# Altium schematic symbol library Analog Devices Data Converters Analog-to-Digital Converters.SchLib: 2404 symbols (part 158 of 213)
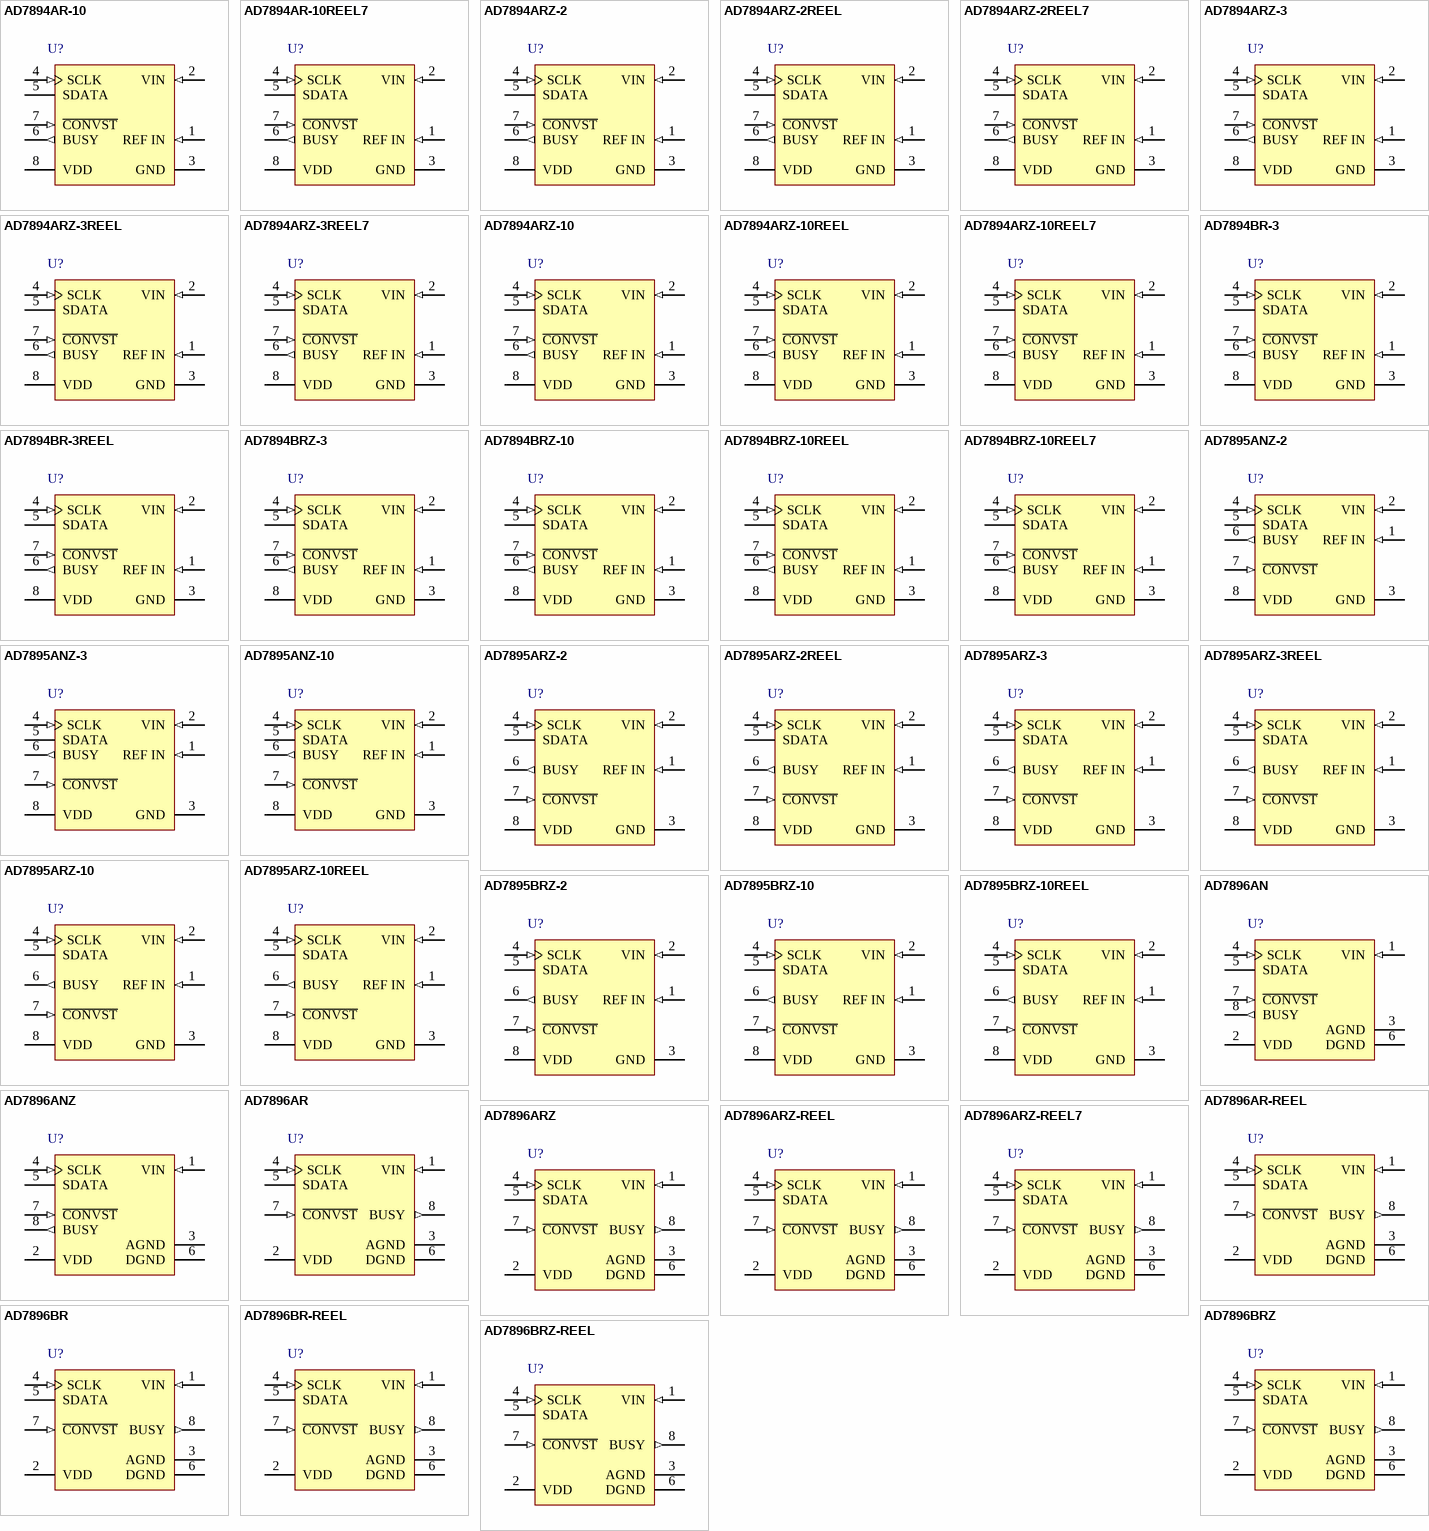
[diagram p313: symbols AD7894AR-10 to AD7896BRZ-REEL]

## AD7896ARZ
designator U?
Single 12-Bit Analog-to-Digital Converter with Serial Interface, 8 us, 2.7 V to 5.5 V, 100KSPS, -40 to +85 degC, R-8, Pb-Free, Tube; Generic Part Number: AD7896; Manufacturer: Analog Devices; PartNumber: AD7896ARZ; Resolution (Bits): 12; Channels: 1; Throughput Rate (SPS): 100K; Interface: Ser; DatasheetVersion: Rev.D; PackageVersion: 060506-A; PackageReference: R-8; PackageDescription: 8-Lead Standard Small Outline Package [SOIC_N] Narrow Body; Supplier 1: Digi-Key; Supplier Part Number 1: AD7896ARZ-ND; Supplier 2: Farnell; Supplier Part Number 2: 2305577; Supplier 3: Newark; Supplier Part Number 3: 84W7459; Supplier 4: Mouser; Supplier Part Number 4: 584-AD7896ARZ; RoHS: Y; Packing: Tube; Mounting Technology: Surface Mount; Code_JEDEC: MS-012-AA; Code_IPC: SOIC127P600-8; ComponentLink1Description: Manufacturer URL; ComponentLink1URL: http://www.analog.com/en/index.html; ComponentLink2Description: Datasheet; ComponentLink2URL: http://www.analog.com/static/imported-files/data_sheets/AD7896.pdf; ComponentLink3Description: Package Specification; ComponentLink3URL: http://www.analog.com/static/imported-files/packages/PKG_PDF/SOIC_Narrow%20(R)/R_8.pdf; ComponentLink4Description: Product URL; ComponentLink4URL: http://www.analog.com/en/analog-to-digital-converters/ad-converters/ad7896/products/product.html
footprint R-8_N (SOIC, 8-Leads, Body 4.9x3.9mm, Pitch 1.27mm, IPC Medium Density)
footprint R-8_L (SOIC, 8-Leads, Body 4.9x3.9mm, Pitch 1.27mm, IPC High Density)
footprint R-8_M (SOIC, 8-Leads, Body 4.9x3.9mm, Pitch 1.27mm, IPC Low Density)
pins: 1 VIN (in) "Analog Input. The analog input range is 0 V to VDD.", 2 VDD (power) "Positive supply voltage, 2.7 V to 5.5 V", 3 AGND (power) "Analog Ground. Ground reference for track-and-hold, comparator, and DAC.", 4 SCLK (in) "Serial Clock Input. An external serial clock is applied to this input to obtain serial data from the AD7896. A new serial data bit is clocked out on the falling edge of this serial clock. Data is guaranteed valid for 10 ns (See Datasheet)", 5 SDATA (hiz) "Serial Data Output.  Serial data from the AD7896 is provided at this output. The serial data is clocked out by the falling edge of SCLK, but the data can also be read on the falling edge of the SCLK. This is possible because (See Datasheet)", 6 DGND (power) "Digital Ground. Ground reference for digital circuitry", 7 ~{CONVST} (in) "Convert Start. Edge-triggered logic input. On the falling edge of this input, the track-and-hold goes into its hold mode and conversion is initiated. If C\O\N\V\S\T\ is low at the end of conversion, the part goes into (See Datasheet)", 8 BUSY (out) "The BUSY pin is used to indicate when the part is doing a conversion. The BUSY pin goes high on the falling edge of C\O\N\V\S\T\ and returns low when the conversion is complete."

## AD7896ARZ-REEL
designator U?
Single 12-Bit Analog-to-Digital Converter with Serial Interface, 8 us, 2.7 V to 5.5 V, 100KSPS, -40 to +85 degC, R-8, Pb-Free, Reel; Generic Part Number: AD7896; Manufacturer: Analog Devices; PartNumber: AD7896ARZ-REEL; Resolution (Bits): 12; Channels: 1; Throughput Rate (SPS): 100K; Interface: Ser; DatasheetVersion: Rev.D; PackageVersion: 060506-A; PackageReference: R-8; PackageDescription: 8-Lead Standard Small Outline Package [SOIC_N] Narrow Body; Supplier 1: Digi-Key; Supplier Part Number 1: AD7896ARZ-REEL-ND; Supplier 2: Newark; Supplier Part Number 2: 88H0074; Supplier 3: Mouser; Supplier Part Number 3: 584-AD7896ARZ-R; RoHS: Y; Packing: Reel; Mounting Technology: Surface Mount; Code_JEDEC: MS-012-AA; Code_IPC: SOIC127P600-8; ComponentLink1Description: Manufacturer URL; ComponentLink1URL: http://www.analog.com/en/index.html; ComponentLink2Description: Datasheet; ComponentLink2URL: http://www.analog.com/static/imported-files/data_sheets/AD7896.pdf; ComponentLink3Description: Package Specification; ComponentLink3URL: http://www.analog.com/static/imported-files/packages/PKG_PDF/SOIC_Narrow%20(R)/R_8.pdf; ComponentLink4Description: Product URL; ComponentLink4URL: http://www.analog.com/en/analog-to-digital-converters/ad-converters/ad7896/products/product.html
footprint R-8_N (SOIC, 8-Leads, Body 4.9x3.9mm, Pitch 1.27mm, IPC Medium Density)
footprint R-8_L (SOIC, 8-Leads, Body 4.9x3.9mm, Pitch 1.27mm, IPC High Density)
footprint R-8_M (SOIC, 8-Leads, Body 4.9x3.9mm, Pitch 1.27mm, IPC Low Density)
pins: 1 VIN (in) "Analog Input. The analog input range is 0 V to VDD.", 2 VDD (power) "Positive supply voltage, 2.7 V to 5.5 V", 3 AGND (power) "Analog Ground. Ground reference for track-and-hold, comparator, and DAC.", 4 SCLK (in) "Serial Clock Input. An external serial clock is applied to this input to obtain serial data from the AD7896. A new serial data bit is clocked out on the falling edge of this serial clock. Data is guaranteed valid for 10 ns (See Datasheet)", 5 SDATA (hiz) "Serial Data Output.  Serial data from the AD7896 is provided at this output. The serial data is clocked out by the falling edge of SCLK, but the data can also be read on the falling edge of the SCLK. This is possible because (See Datasheet)", 6 DGND (power) "Digital Ground. Ground reference for digital circuitry", 7 ~{CONVST} (in) "Convert Start. Edge-triggered logic input. On the falling edge of this input, the track-and-hold goes into its hold mode and conversion is initiated. If C\O\N\V\S\T\ is low at the end of conversion, the part goes into (See Datasheet)", 8 BUSY (out) "The BUSY pin is used to indicate when the part is doing a conversion. The BUSY pin goes high on the falling edge of C\O\N\V\S\T\ and returns low when the conversion is complete."

## AD7896ARZ-REEL7
designator U?
Single 12-Bit Analog-to-Digital Converter with Serial Interface, 8 us, 2.7 V to 5.5 V, 100KSPS, 0 to +70 degC, R-8, Pb-Free, Reel; Generic Part Number: AD7896; Manufacturer: Analog Devices; PartNumber: AD7896ARZ-REEL7; Resolution (Bits): 12; Channels: 1; Throughput Rate (SPS): 100K; Interface: Ser; DatasheetVersion: Rev.D; PackageVersion: 060506-A; PackageReference: R-8; PackageDescription: 8-Lead Standard Small Outline Package [SOIC_N] Narrow Body; Supplier 1: Digi-Key; Supplier Part Number 1: AD7896ARZ-REEL7-ND; Supplier 2: Newark; Supplier Part Number 2: 88H0075; Supplier 3: Mouser; Supplier Part Number 3: 584-AD7896ARZ-R7; RoHS: Y; Packing: Reel; Mounting Technology: Surface Mount; Code_JEDEC: MS-012-AA; Code_IPC: SOIC127P600-8; ComponentLink1Description: Manufacturer URL; ComponentLink1URL: http://www.analog.com/en/index.html; ComponentLink2Description: Datasheet; ComponentLink2URL: http://www.analog.com/static/imported-files/data_sheets/AD7896.pdf; ComponentLink3Description: Package Specification; ComponentLink3URL: http://www.analog.com/static/imported-files/packages/PKG_PDF/SOIC_Narrow%20(R)/R_8.pdf; ComponentLink4Description: Product URL; ComponentLink4URL: http://www.analog.com/en/analog-to-digital-converters/ad-converters/ad7896/products/product.html
footprint R-8_N (SOIC, 8-Leads, Body 4.9x3.9mm, Pitch 1.27mm, IPC Medium Density)
footprint R-8_L (SOIC, 8-Leads, Body 4.9x3.9mm, Pitch 1.27mm, IPC High Density)
footprint R-8_M (SOIC, 8-Leads, Body 4.9x3.9mm, Pitch 1.27mm, IPC Low Density)
pins: 1 VIN (in) "Analog Input. The analog input range is 0 V to VDD.", 2 VDD (power) "Positive supply voltage, 2.7 V to 5.5 V", 3 AGND (power) "Analog Ground. Ground reference for track-and-hold, comparator, and DAC.", 4 SCLK (in) "Serial Clock Input. An external serial clock is applied to this input to obtain serial data from the AD7896. A new serial data bit is clocked out on the falling edge of this serial clock. Data is guaranteed valid for 10 ns (See Datasheet)", 5 SDATA (hiz) "Serial Data Output.  Serial data from the AD7896 is provided at this output. The serial data is clocked out by the falling edge of SCLK, but the data can also be read on the falling edge of the SCLK. This is possible because (See Datasheet)", 6 DGND (power) "Digital Ground. Ground reference for digital circuitry", 7 ~{CONVST} (in) "Convert Start. Edge-triggered logic input. On the falling edge of this input, the track-and-hold goes into its hold mode and conversion is initiated. If C\O\N\V\S\T\ is low at the end of conversion, the part goes into (See Datasheet)", 8 BUSY (out) "The BUSY pin is used to indicate when the part is doing a conversion. The BUSY pin goes high on the falling edge of C\O\N\V\S\T\ and returns low when the conversion is complete."

## AD7896BR
designator U?
Single 12-Bit Analog-to-Digital Converter with Serial Interface, 8 us, 2.7 V to 5.5 V, 100KSPS, -40 to +85 degC, R-8, Tube; Generic Part Number: AD7896; Manufacturer: Analog Devices; PartNumber: AD7896BR; Resolution (Bits): 12; Channels: 1; Throughput Rate (SPS): 100K; Interface: Ser; DatasheetVersion: Rev.D; PackageVersion: 060506-A; PackageReference: R-8; PackageDescription: 8-Lead Standard Small Outline Package [SOIC_N] Narrow Body; Supplier 1: Digi-Key; Supplier Part Number 1: AD7896BR-ND; Supplier 2: Mouser; Supplier Part Number 2: 584-AD7896BR; RoHS: N; Packing: Tube; Mounting Technology: Surface Mount; Code_JEDEC: MS-012-AA; Code_IPC: SOIC127P600-8; ComponentLink1Description: Manufacturer URL; ComponentLink1URL: http://www.analog.com/en/index.html; ComponentLink2Description: Datasheet; ComponentLink2URL: http://www.analog.com/static/imported-files/data_sheets/AD7896.pdf; ComponentLink3Description: Package Specification; ComponentLink3URL: http://www.analog.com/static/imported-files/packages/PKG_PDF/SOIC_Narrow%20(R)/R_8.pdf; ComponentLink4Description: Product URL; ComponentLink4URL: http://www.analog.com/en/analog-to-digital-converters/ad-converters/ad7896/products/product.html
footprint R-8_N (SOIC, 8-Leads, Body 4.9x3.9mm, Pitch 1.27mm, IPC Medium Density)
footprint R-8_L (SOIC, 8-Leads, Body 4.9x3.9mm, Pitch 1.27mm, IPC High Density)
footprint R-8_M (SOIC, 8-Leads, Body 4.9x3.9mm, Pitch 1.27mm, IPC Low Density)
pins: 1 VIN (in) "Analog Input. The analog input range is 0 V to VDD.", 2 VDD (power) "Positive supply voltage, 2.7 V to 5.5 V", 3 AGND (power) "Analog Ground. Ground reference for track-and-hold, comparator, and DAC.", 4 SCLK (in) "Serial Clock Input. An external serial clock is applied to this input to obtain serial data from the AD7896. A new serial data bit is clocked out on the falling edge of this serial clock. Data is guaranteed valid for 10 ns (See Datasheet)", 5 SDATA (hiz) "Serial Data Output.  Serial data from the AD7896 is provided at this output. The serial data is clocked out by the falling edge of SCLK, but the data can also be read on the falling edge of the SCLK. This is possible because (See Datasheet)", 6 DGND (power) "Digital Ground. Ground reference for digital circuitry", 7 ~{CONVST} (in) "Convert Start. Edge-triggered logic input. On the falling edge of this input, the track-and-hold goes into its hold mode and conversion is initiated. If C\O\N\V\S\T\ is low at the end of conversion, the part goes into (See Datasheet)", 8 BUSY (out) "The BUSY pin is used to indicate when the part is doing a conversion. The BUSY pin goes high on the falling edge of C\O\N\V\S\T\ and returns low when the conversion is complete."

## AD7896BR-REEL
designator U?
Single 12-Bit Analog-to-Digital Converter with Serial Interface, 8 us, 2.7 V to 5.5 V, 100KSPS, -40 to +85 degC, R-8, Reel; Generic Part Number: AD7896; Manufacturer: Analog Devices; PartNumber: AD7896BR-REEL; Resolution (Bits): 12; Channels: 1; Throughput Rate (SPS): 100K; Interface: Ser; DatasheetVersion: Rev.D; PackageVersion: 060506-A; PackageReference: R-8; PackageDescription: 8-Lead Standard Small Outline Package [SOIC_N] Narrow Body; Supplier 1: Digi-Key; Supplier Part Number 1: AD7896BR-REEL-ND; Supplier 2: Newark; Supplier Part Number 2: 09B6296; Supplier 3: Mouser; Supplier Part Number 3: 584-AD7896BR-R; RoHS: N; Packing: Reel; Mounting Technology: Surface Mount; Code_JEDEC: MS-012-AA; Code_IPC: SOIC127P600-8; ComponentLink1Description: Manufacturer URL; ComponentLink1URL: http://www.analog.com/en/index.html; ComponentLink2Description: Datasheet; ComponentLink2URL: http://www.analog.com/static/imported-files/data_sheets/AD7896.pdf; ComponentLink3Description: Package Specification; ComponentLink3URL: http://www.analog.com/static/imported-files/packages/PKG_PDF/SOIC_Narrow%20(R)/R_8.pdf; ComponentLink4Description: Product URL; ComponentLink4URL: http://www.analog.com/en/analog-to-digital-converters/ad-converters/ad7896/products/product.html
footprint R-8_N (SOIC, 8-Leads, Body 4.9x3.9mm, Pitch 1.27mm, IPC Medium Density)
footprint R-8_L (SOIC, 8-Leads, Body 4.9x3.9mm, Pitch 1.27mm, IPC High Density)
footprint R-8_M (SOIC, 8-Leads, Body 4.9x3.9mm, Pitch 1.27mm, IPC Low Density)
pins: 1 VIN (in) "Analog Input. The analog input range is 0 V to VDD.", 2 VDD (power) "Positive supply voltage, 2.7 V to 5.5 V", 3 AGND (power) "Analog Ground. Ground reference for track-and-hold, comparator, and DAC.", 4 SCLK (in) "Serial Clock Input. An external serial clock is applied to this input to obtain serial data from the AD7896. A new serial data bit is clocked out on the falling edge of this serial clock. Data is guaranteed valid for 10 ns (See Datasheet)", 5 SDATA (hiz) "Serial Data Output.  Serial data from the AD7896 is provided at this output. The serial data is clocked out by the falling edge of SCLK, but the data can also be read on the falling edge of the SCLK. This is possible because (See Datasheet)", 6 DGND (power) "Digital Ground. Ground reference for digital circuitry", 7 ~{CONVST} (in) "Convert Start. Edge-triggered logic input. On the falling edge of this input, the track-and-hold goes into its hold mode and conversion is initiated. If C\O\N\V\S\T\ is low at the end of conversion, the part goes into (See Datasheet)", 8 BUSY (out) "The BUSY pin is used to indicate when the part is doing a conversion. The BUSY pin goes high on the falling edge of C\O\N\V\S\T\ and returns low when the conversion is complete."

## AD7896BRZ
designator U?
Single 12-Bit Analog-to-Digital Converter with Serial Interface, 8 us, 2.7 V to 5.5 V, 100KSPS, -40 to +85 degC, R-8, Pb-Free, Tube; Generic Part Number: AD7896; Manufacturer: Analog Devices; PartNumber: AD7896BRZ; Resolution (Bits): 12; Channels: 1; Throughput Rate (SPS): 100K; Interface: Ser; DatasheetVersion: Rev.D; PackageVersion: 060506-A; PackageReference: R-8; PackageDescription: 8-Lead Standard Small Outline Package [SOIC_N] Narrow Body; Supplier 1: Digi-Key; Supplier Part Number 1: AD7896BRZ-ND; Supplier 2: Newark; Supplier Part Number 2: 59K5925; Supplier 3: Mouser; Supplier Part Number 3: 584-AD7896BRZ; RoHS: Y; Packing: Tube; Mounting Technology: Surface Mount; Code_JEDEC: MS-012-AA; Code_IPC: SOIC127P600-8; ComponentLink1Description: Manufacturer URL; ComponentLink1URL: http://www.analog.com/en/index.html; ComponentLink2Description: Datasheet; ComponentLink2URL: http://www.analog.com/static/imported-files/data_sheets/AD7896.pdf; ComponentLink3Description: Package Specification; ComponentLink3URL: http://www.analog.com/static/imported-files/packages/PKG_PDF/SOIC_Narrow%20(R)/R_8.pdf; ComponentLink4Description: Product URL; ComponentLink4URL: http://www.analog.com/en/analog-to-digital-converters/ad-converters/ad7896/products/product.html
footprint R-8_N (SOIC, 8-Leads, Body 4.9x3.9mm, Pitch 1.27mm, IPC Medium Density)
footprint R-8_L (SOIC, 8-Leads, Body 4.9x3.9mm, Pitch 1.27mm, IPC High Density)
footprint R-8_M (SOIC, 8-Leads, Body 4.9x3.9mm, Pitch 1.27mm, IPC Low Density)
pins: 1 VIN (in) "Analog Input. The analog input range is 0 V to VDD.", 2 VDD (power) "Positive supply voltage, 2.7 V to 5.5 V", 3 AGND (power) "Analog Ground. Ground reference for track-and-hold, comparator, and DAC.", 4 SCLK (in) "Serial Clock Input. An external serial clock is applied to this input to obtain serial data from the AD7896. A new serial data bit is clocked out on the falling edge of this serial clock. Data is guaranteed valid for 10 ns (See Datasheet)", 5 SDATA (hiz) "Serial Data Output.  Serial data from the AD7896 is provided at this output. The serial data is clocked out by the falling edge of SCLK, but the data can also be read on the falling edge of the SCLK. This is possible because (See Datasheet)", 6 DGND (power) "Digital Ground. Ground reference for digital circuitry", 7 ~{CONVST} (in) "Convert Start. Edge-triggered logic input. On the falling edge of this input, the track-and-hold goes into its hold mode and conversion is initiated. If C\O\N\V\S\T\ is low at the end of conversion, the part goes into (See Datasheet)", 8 BUSY (out) "The BUSY pin is used to indicate when the part is doing a conversion. The BUSY pin goes high on the falling edge of C\O\N\V\S\T\ and returns low when the conversion is complete."

## AD7896BRZ-REEL
designator U?
Single 12-Bit Analog-to-Digital Converter with Serial Interface, 8 us, 2.7 V to 5.5 V, 100KSPS, -40 to +85 degC, R-8, Pb-Free, Reel; Generic Part Number: AD7896; Manufacturer: Analog Devices; PartNumber: AD7896BRZ-REEL; Resolution (Bits): 12; Channels: 1; Throughput Rate (SPS): 100K; Interface: Ser; DatasheetVersion: Rev.D; PackageVersion: 060506-A; PackageReference: R-8; PackageDescription: 8-Lead Standard Small Outline Package [SOIC_N] Narrow Body; Supplier 1: Digi-Key; Supplier Part Number 1: AD7896BRZ-REEL-ND; Supplier 2: Newark; Supplier Part Number 2: 59K5926; Supplier 3: Mouser; Supplier Part Number 3: 584-AD7896BRZ-R; RoHS: Y; Packing: Reel; Mounting Technology: Surface Mount; Code_JEDEC: MS-012-AA; Code_IPC: SOIC127P600-8; ComponentLink1Description: Manufacturer URL; ComponentLink1URL: http://www.analog.com/en/index.html; ComponentLink2Description: Datasheet; ComponentLink2URL: http://www.analog.com/static/imported-files/data_sheets/AD7896.pdf; ComponentLink3Description: Package Specification; ComponentLink3URL: http://www.analog.com/static/imported-files/packages/PKG_PDF/SOIC_Narrow%20(R)/R_8.pdf; ComponentLink4Description: Product URL; ComponentLink4URL: http://www.analog.com/en/analog-to-digital-converters/ad-converters/ad7896/products/product.html
footprint R-8_N (SOIC, 8-Leads, Body 4.9x3.9mm, Pitch 1.27mm, IPC Medium Density)
footprint R-8_L (SOIC, 8-Leads, Body 4.9x3.9mm, Pitch 1.27mm, IPC High Density)
footprint R-8_M (SOIC, 8-Leads, Body 4.9x3.9mm, Pitch 1.27mm, IPC Low Density)
pins: 1 VIN (in) "Analog Input. The analog input range is 0 V to VDD.", 2 VDD (power) "Positive supply voltage, 2.7 V to 5.5 V", 3 AGND (power) "Analog Ground. Ground reference for track-and-hold, comparator, and DAC.", 4 SCLK (in) "Serial Clock Input. An external serial clock is applied to this input to obtain serial data from the AD7896. A new serial data bit is clocked out on the falling edge of this serial clock. Data is guaranteed valid for 10 ns (See Datasheet)", 5 SDATA (hiz) "Serial Data Output.  Serial data from the AD7896 is provided at this output. The serial data is clocked out by the falling edge of SCLK, but the data can also be read on the falling edge of the SCLK. This is possible because (See Datasheet)", 6 DGND (power) "Digital Ground. Ground reference for digital circuitry", 7 ~{CONVST} (in) "Convert Start. Edge-triggered logic input. On the falling edge of this input, the track-and-hold goes into its hold mode and conversion is initiated. If C\O\N\V\S\T\ is low at the end of conversion, the part goes into (See Datasheet)", 8 BUSY (out) "The BUSY pin is used to indicate when the part is doing a conversion. The BUSY pin goes high on the falling edge of C\O\N\V\S\T\ and returns low when the conversion is complete."

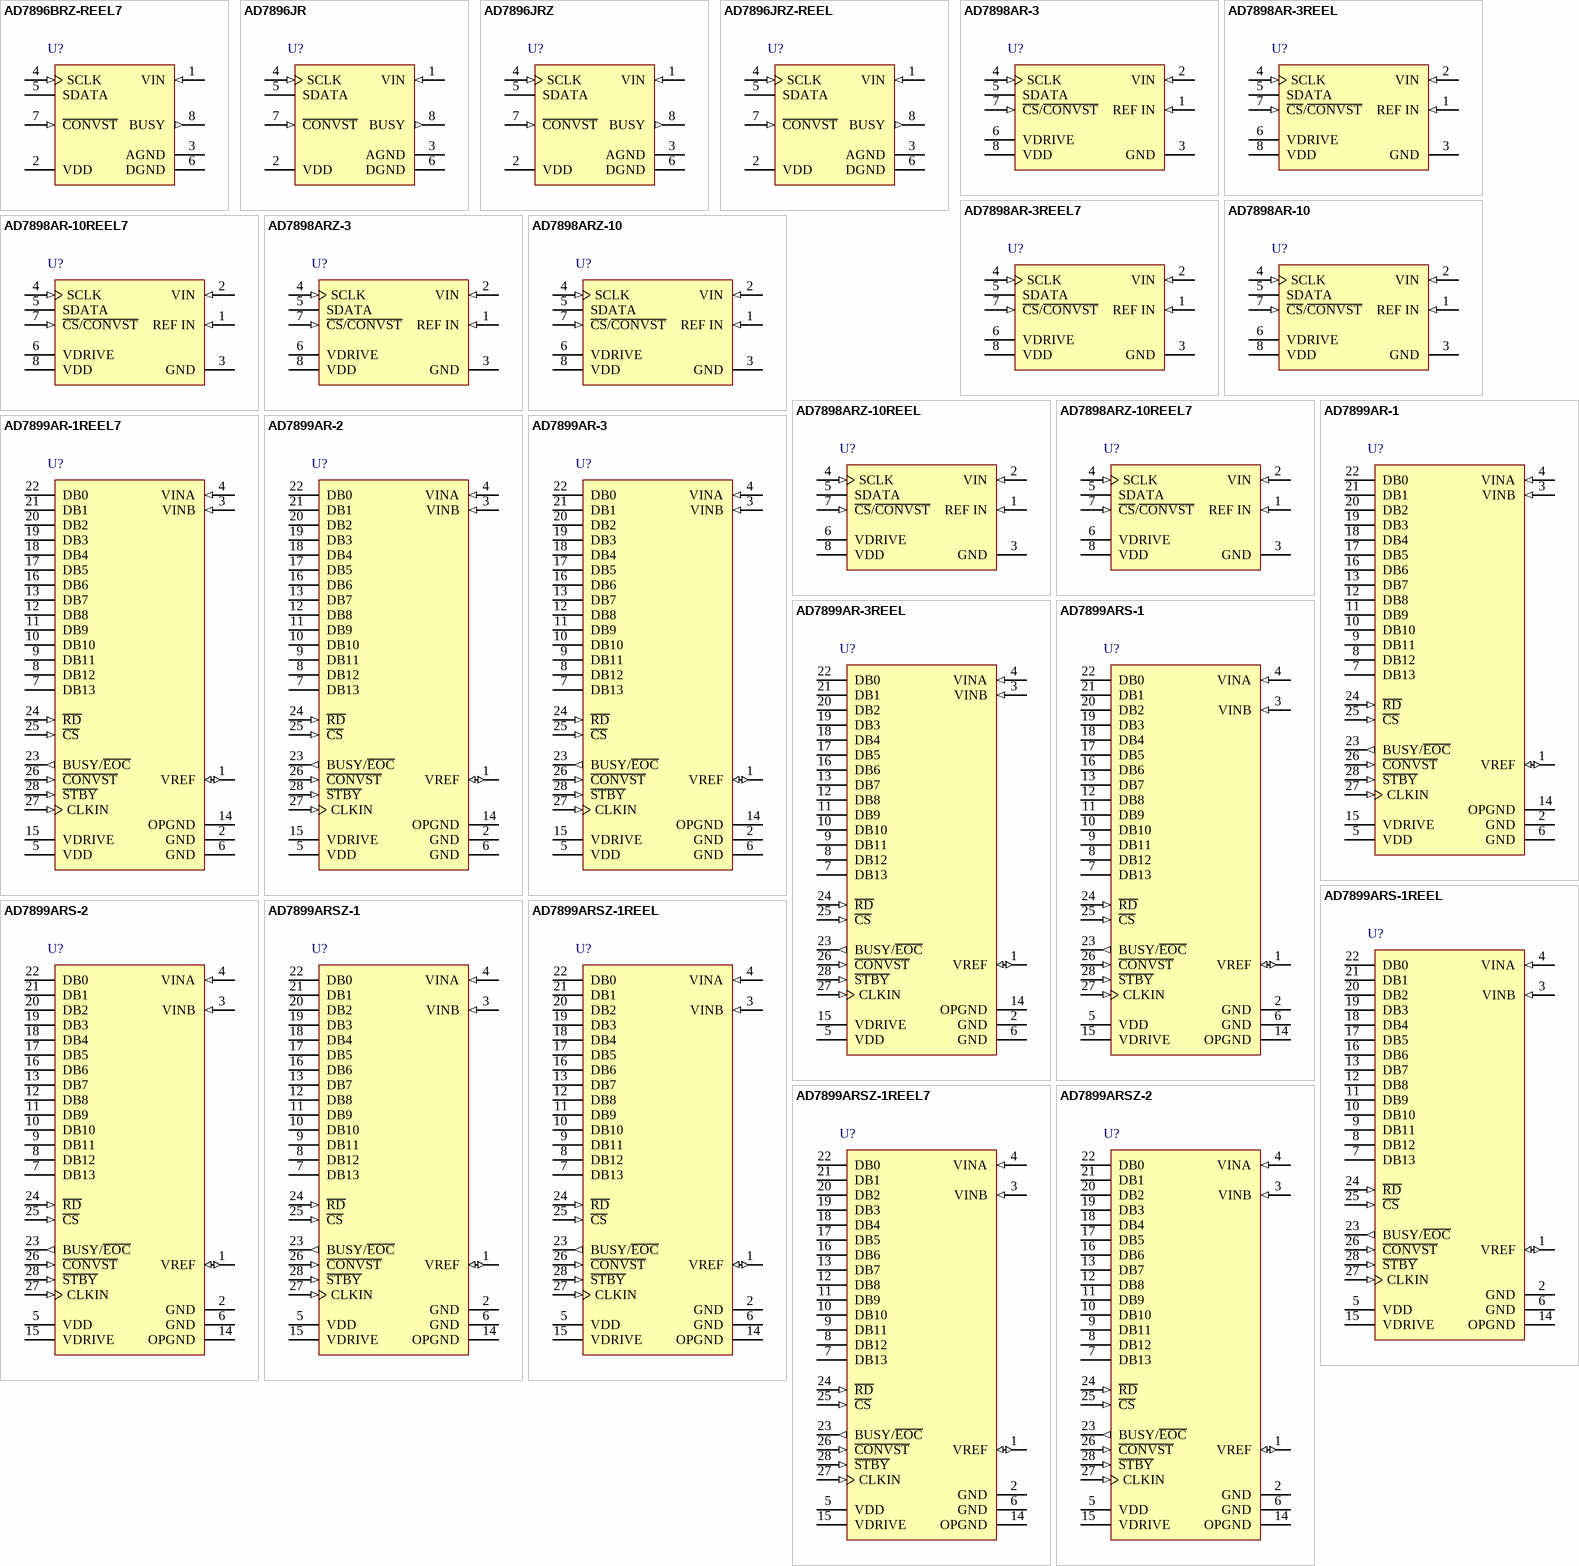
[diagram p87: symbols AD7896BRZ-REEL7 to AD7899ARSZ-2]

## AD7896BRZ-REEL7
designator U?
Single 12-Bit Analog-to-Digital Converter with Serial Interface, 8 us, 2.7 V to 5.5 V, 100KSPS, 0 to +70 degC, R-8, Pb-Free, Reel; Generic Part Number: AD7896; Manufacturer: Analog Devices; PartNumber: AD7896BRZ-REEL7; Resolution (Bits): 12; Channels: 1; Throughput Rate (SPS): 100K; Interface: Ser; DatasheetVersion: Rev.D; PackageVersion: 060506-A; PackageReference: R-8; PackageDescription: 8-Lead Standard Small Outline Package [SOIC_N] Narrow Body; Supplier 1: Digi-Key; Supplier Part Number 1: AD7896BRZ-REEL7-ND; Supplier 2: Newark; Supplier Part Number 2: 59K5927; Supplier 3: Mouser; Supplier Part Number 3: 584-AD7896BRZ-R7; RoHS: Y; Packing: Reel; Mounting Technology: Surface Mount; Code_JEDEC: MS-012-AA; Code_IPC: SOIC127P600-8; ComponentLink1Description: Manufacturer URL; ComponentLink1URL: http://www.analog.com/en/index.html; ComponentLink2Description: Datasheet; ComponentLink2URL: http://www.analog.com/static/imported-files/data_sheets/AD7896.pdf; ComponentLink3Description: Package Specification; ComponentLink3URL: http://www.analog.com/static/imported-files/packages/PKG_PDF/SOIC_Narrow%20(R)/R_8.pdf; ComponentLink4Description: Product URL; ComponentLink4URL: http://www.analog.com/en/analog-to-digital-converters/ad-converters/ad7896/products/product.html
footprint R-8_N (SOIC, 8-Leads, Body 4.9x3.9mm, Pitch 1.27mm, IPC Medium Density)
footprint R-8_L (SOIC, 8-Leads, Body 4.9x3.9mm, Pitch 1.27mm, IPC High Density)
footprint R-8_M (SOIC, 8-Leads, Body 4.9x3.9mm, Pitch 1.27mm, IPC Low Density)
pins: 1 VIN (in) "Analog Input. The analog input range is 0 V to VDD.", 2 VDD (power) "Positive supply voltage, 2.7 V to 5.5 V", 3 AGND (power) "Analog Ground. Ground reference for track-and-hold, comparator, and DAC.", 4 SCLK (in) "Serial Clock Input. An external serial clock is applied to this input to obtain serial data from the AD7896. A new serial data bit is clocked out on the falling edge of this serial clock. Data is guaranteed valid for 10 ns (See Datasheet)", 5 SDATA (hiz) "Serial Data Output.  Serial data from the AD7896 is provided at this output. The serial data is clocked out by the falling edge of SCLK, but the data can also be read on the falling edge of the SCLK. This is possible because (See Datasheet)", 6 DGND (power) "Digital Ground. Ground reference for digital circuitry", 7 ~{CONVST} (in) "Convert Start. Edge-triggered logic input. On the falling edge of this input, the track-and-hold goes into its hold mode and conversion is initiated. If C\O\N\V\S\T\ is low at the end of conversion, the part goes into (See Datasheet)", 8 BUSY (out) "The BUSY pin is used to indicate when the part is doing a conversion. The BUSY pin goes high on the falling edge of C\O\N\V\S\T\ and returns low when the conversion is complete."

## AD7896JR
designator U?
Single 12-Bit Analog-to-Digital Converter with Serial Interface, 8 us, 2.7 V to 5.5 V, 100KSPS, 0 to +70 degC, R-8, Tube; Generic Part Number: AD7896; Manufacturer: Analog Devices; PartNumber: AD7896JR; Resolution (Bits): 12; Channels: 1; Throughput Rate (SPS): 100K; Interface: Ser; DatasheetVersion: Rev.D; PackageVersion: 060506-A; PackageReference: R-8; PackageDescription: 8-Lead Standard Small Outline Package [SOIC_N] Narrow Body; Supplier 1: Digi-Key; Supplier Part Number 1: AD7896JR-ND; RoHS: N; Packing: Tube; Mounting Technology: Surface Mount; Code_JEDEC: MS-012-AA; Code_IPC: SOIC127P600-8; ComponentLink1Description: Manufacturer URL; ComponentLink1URL: http://www.analog.com/en/index.html; ComponentLink2Description: Datasheet; ComponentLink2URL: http://www.analog.com/static/imported-files/data_sheets/AD7896.pdf; ComponentLink3Description: Package Specification; ComponentLink3URL: http://www.analog.com/static/imported-files/packages/PKG_PDF/SOIC_Narrow%20(R)/R_8.pdf; ComponentLink4Description: Product URL; ComponentLink4URL: http://www.analog.com/en/analog-to-digital-converters/ad-converters/ad7896/products/product.html
footprint R-8_N (SOIC, 8-Leads, Body 4.9x3.9mm, Pitch 1.27mm, IPC Medium Density)
footprint R-8_L (SOIC, 8-Leads, Body 4.9x3.9mm, Pitch 1.27mm, IPC High Density)
footprint R-8_M (SOIC, 8-Leads, Body 4.9x3.9mm, Pitch 1.27mm, IPC Low Density)
pins: 1 VIN (in) "Analog Input. The analog input range is 0 V to VDD.", 2 VDD (power) "Positive supply voltage, 2.7 V to 5.5 V", 3 AGND (power) "Analog Ground. Ground reference for track-and-hold, comparator, and DAC.", 4 SCLK (in) "Serial Clock Input. An external serial clock is applied to this input to obtain serial data from the AD7896. A new serial data bit is clocked out on the falling edge of this serial clock. Data is guaranteed valid for 10 ns (See Datasheet)", 5 SDATA (hiz) "Serial Data Output.  Serial data from the AD7896 is provided at this output. The serial data is clocked out by the falling edge of SCLK, but the data can also be read on the falling edge of the SCLK. This is possible because (See Datasheet)", 6 DGND (power) "Digital Ground. Ground reference for digital circuitry", 7 ~{CONVST} (in) "Convert Start. Edge-triggered logic input. On the falling edge of this input, the track-and-hold goes into its hold mode and conversion is initiated. If C\O\N\V\S\T\ is low at the end of conversion, the part goes into (See Datasheet)", 8 BUSY (out) "The BUSY pin is used to indicate when the part is doing a conversion. The BUSY pin goes high on the falling edge of C\O\N\V\S\T\ and returns low when the conversion is complete."

## AD7896JRZ
designator U?
Single 12-Bit Analog-to-Digital Converter with Serial Interface, 8 us, 2.7 V to 5.5 V, 100KSPS, 0 to +70 degC, R-8, Pb-Free, Tube; Generic Part Number: AD7896; Manufacturer: Analog Devices; PartNumber: AD7896JRZ; Resolution (Bits): 12; Channels: 1; Throughput Rate (SPS): 100K; Interface: Ser; DatasheetVersion: Rev.D; PackageVersion: 060506-A; PackageReference: R-8; PackageDescription: 8-Lead Standard Small Outline Package [SOIC_N] Narrow Body; Supplier 1: Digi-Key; Supplier Part Number 1: AD7896JRZ-ND; Supplier 2: Newark; Supplier Part Number 2: 59K5928; Supplier 3: Mouser; Supplier Part Number 3: 584-AD7896JRZ; RoHS: Y; Packing: Tube; Mounting Technology: Surface Mount; Code_JEDEC: MS-012-AA; Code_IPC: SOIC127P600-8; ComponentLink1Description: Manufacturer URL; ComponentLink1URL: http://www.analog.com/en/index.html; ComponentLink2Description: Datasheet; ComponentLink2URL: http://www.analog.com/static/imported-files/data_sheets/AD7896.pdf; ComponentLink3Description: Package Specification; ComponentLink3URL: http://www.analog.com/static/imported-files/packages/PKG_PDF/SOIC_Narrow%20(R)/R_8.pdf; ComponentLink4Description: Product URL; ComponentLink4URL: http://www.analog.com/en/analog-to-digital-converters/ad-converters/ad7896/products/product.html
footprint R-8_N (SOIC, 8-Leads, Body 4.9x3.9mm, Pitch 1.27mm, IPC Medium Density)
footprint R-8_L (SOIC, 8-Leads, Body 4.9x3.9mm, Pitch 1.27mm, IPC High Density)
footprint R-8_M (SOIC, 8-Leads, Body 4.9x3.9mm, Pitch 1.27mm, IPC Low Density)
pins: 1 VIN (in) "Analog Input. The analog input range is 0 V to VDD.", 2 VDD (power) "Positive supply voltage, 2.7 V to 5.5 V", 3 AGND (power) "Analog Ground. Ground reference for track-and-hold, comparator, and DAC.", 4 SCLK (in) "Serial Clock Input. An external serial clock is applied to this input to obtain serial data from the AD7896. A new serial data bit is clocked out on the falling edge of this serial clock. Data is guaranteed valid for 10 ns (See Datasheet)", 5 SDATA (hiz) "Serial Data Output.  Serial data from the AD7896 is provided at this output. The serial data is clocked out by the falling edge of SCLK, but the data can also be read on the falling edge of the SCLK. This is possible because (See Datasheet)", 6 DGND (power) "Digital Ground. Ground reference for digital circuitry", 7 ~{CONVST} (in) "Convert Start. Edge-triggered logic input. On the falling edge of this input, the track-and-hold goes into its hold mode and conversion is initiated. If C\O\N\V\S\T\ is low at the end of conversion, the part goes into (See Datasheet)", 8 BUSY (out) "The BUSY pin is used to indicate when the part is doing a conversion. The BUSY pin goes high on the falling edge of C\O\N\V\S\T\ and returns low when the conversion is complete."
